# Altium integrated library Blues Wireless Library.IntLib: 99 symbols (part 1 of 2) (continued)
## EDGE-200-CM3_0 (continued)
text: TOP; BOTTOM

## EDGE-200-CM3_1
designator J?, comment TPS  (value not drawn)
Modello: EDGE-DDR2; Caratteristiche: 200P; Famiglia: CONNETTORE
footprint DDR2-EDGE-200
pins: 1 GND (power), 2 ~{EMMC_DISABLE}, 3 GPIO0 (io), 4 SDX_VDD (power), 5 GPIO1 (io), 6 SDX_VDD (power), 7 GND (power), 8 GND (power), 9 GPIO2 (io), 10 SDX_CLK (in), 11 GPIO3 (io), 12 SDX_CMD (io), 13 GND (power), 14 GND (power), 15 GPIO4 (io), 16 SDX_D0 (io), 17 GPIO5 (io), 18 SDX_D1 (io), 19 GND (power), 20 GND (power), 21 GPIO6 (io), 22 SDX_D2 (io), 23 GPIO7 (io), 24 SDX_D3 (io), 25 GND (power), 26 GND (power), 27 GPIO8 (io), 28 GPIO28 (io), 29 GPIO9 (io), 30 GPIO29 (io), 31 GND (power), 32 GND (power), 33 GPIO10 (io), 34 GPIO30 (io), 35 GPIO11 (io), 36 GPIO31 (io), 37 GND (power), 38 GND (power), 39 GPIO0-27_VDD (power), 40 GPIO0-27_VDD (power), 41 GPIO28-45_VDD (power), 42 GPIO28-45_VDD (power), 43 GND (power), 44 GND (power), 45 GPIO12 (io), 46 GPIO32 (io), 47 GPIO13 (io), 48 GPIO33 (io), 49 GND (power), 50 GND (power), 51 GPIO14 (io), 52 GPIO34 (io), 53 GPIO15 (io), 54 GPIO35 (io), 55 GND (power), 56 GND (power), 57 GPIO16 (io), 58 GPIO36 (io), 59 GPIO17 (io), 60 GPIO37 (io), 61 GND (power), 62 GND (power), 63 GPIO18 (io), 64 GPIO38 (io), 65 GPIO19 (io), 66 GPIO39 (io), 67 GND (power), 68 GND (power), 69 GPIO20 (io), 70 GPIO40 (io), 71 GPIO21 (io), 72 GPIO41 (io), 73 GND (power), 74 GND (power), 75 GPIO22 (io), 76 GPIO42 (io), 77 GPIO23 (io), 78 GPIO43 (io), 79 GND (power), 80 GND (power), 81 GPIO24 (io), 82 GPIO44 (io), 83 GPIO25 (io), 84 GPIO45 (io), 85 GND (power), 86 GND (power), 87 GPIO26 (io), 88 ~{HDMI_HPD_1V8} (out), 89 GPIO27 (io), 90 ~{EMMC_EN_1V8} (in), 91 GND (power), 92 GND (power), 93 DSI0_DN1 (in), 94 DSI1_DP0 (in), 95 DSI0_DP1 (in), 96 DSI1_DN0 (in), 97 GND (power), 98 GND (power), 99 DSI0_DN0 (in), 100 DSI1_CP (in), 101 DSI0_DP0 (in), 102 DSI1_CN (in), 103 GND (power), 104 GND (power), 105 DSI0_CN (in), 106 DSI1_DP3 (out), 107 DSI0_CP (in), 108 DSI1_DN3 (out), 109 GND (power), 110 GND (power), 111 HDMI_CLK_N (in), 112 DSI1_DP2 (in), 113 HDMI_CLK_P (in), 114 DSI1_DN2 (in), 115 GND (power), 116 GND (power), 117 HDMI_D0_N (in), 118 DSI1_DP1 (in), 119 HDMI_D0_P (in), 120 DSI1_DN1 (in), 121 GND (power), 122 GND (power), 123 HDMI_D1_N (in), 124 NC124, 125 HDMI_D1_P (in), 126 NC126, 127 GND (power), 128 NC128, 129 HDMI_D2_N (in), 130 NC130, 131 HDMI_D2_P (in), 132 NC132, 133 GND (power), 134 GND (power), 135 CAM1_DP3 (out), 136 CAM0_DP0 (out), 137 CAM1_DN3 (out), 138 CAM0_DN0 (out), 139 GND (power), 140 GND (power), 141 CAM1_DP2 (out), 142 CAM0_CP (out), 143 CAM1_DN2 (out), 144 CAM0_CN (out), 145 GND (power), 146 GND (power), 147 CAM1_CP (out), 148 CAM0_DP1 (out), 149 CAM1_CN (out), 150 CAM0_DN1 (out), 151 GND (power), 152 GND (power), 153 CAM1_DP1 (out), 154 NC154, 155 CAM1_DN1 (out), 156 NC156, 157 GND (power), 158 NC158, 159 CAM1_DP0 (out), 160 NC160, 161 CAM1_DN0 (out), 162 NC162, 163 GND (power), 164 GND (power), 165 USB_DP (io), 166 TVDAC (in), 167 USB_DM (io), 168 USB_OTGID (out), 169 GND (power), 170 GND (power), 171 HDMI_CEC (io), 172 ~{VC_TRST} (out), 173 HDMI_SDA (io), 174 VC_TDI (out), 175 HDMI_SCL (io), 176 VC_TMS (out), 177 RUN (out), 178 VC_TDO (in), 179 NC179, 180 VC_TCK (out), 181 GND (power), 182 GND (power), 183 NC183, 184 NC184, 185 NC185, 186 NC186, 187 GND (power), 188 GND (power), 189 NC189, 190 NC190, 191 NC191, 192 NC192, 193 NC193, 194 NC194, 195 GND (power), 196 GND (power), 197 VBAT (power), 198 VBAT (power), 199 VBAT (power), 200 VBAT (power)
text: TOP; BOTTOM

## FIDUCIAL
designator FID?, comment TPS  (value not drawn)
FIDUCIAL; Pkg Type: SMD; Distributor: FAE
footprint FIDUCIAL
pins: 1 TP

## GROVE - J-4-0200-MOS-GROVE
designator J?, comment GROVE
CONN. GROVE 4P M/90° P=2 1125R-SMT-4P SEEDSTUDIO SMT; Pkg Type: SMD; Famiglia: CONNETTORE; Database: 45891; Price Distributor Cad: 0,16; Modello: GROVE; Distributor: FAE; Caratteristiche: 4P
footprint J-4-0200-MOS-GROVE
pins: 1, 2, 3, 4

## KNOB - M2.5
designator ASS?, comment KNOB M2.5
VITE TCEI 2.5X5 ESAGONO INCASSATO A2 NERA; Database: 45057; Famiglia: MECCANICA; Pkg Type: THT; Caratteristiche: M2.5; Distributor: FAE; Modello: KNOB; Price Distributor Cad: 0,1467

## L - 0603CS-3N3XJLU-3.3n/0.7A
designator L?, comment 0603CS-3N3XJLU
INDUTTANZA 3.3nH 0.7A 5% 0603 0603CS-3N3XJLU COILCRAFT SMT; Caratteristiche: 700mA; Database: 43077; Famiglia: INDUTTORE; Modello: INDUTTANZA RF; Note: 5.9GHz; Pkg Type: SMD; Temp Range: -40°..+125°; Distributor: FAE; Price Distributor Cad: 0,59
footprint LS-0603CS
pins: 1 C, 2 A

## L - 0603CS-6N8XJLU-6.8n/0.7A
designator L?, comment 0603CS-6N8XJLU
INDUTTANZA 6.8nH 0.7A 5% 0603 0603CS-6N8XJLU COILCRAFT SMT; Caratteristiche: 700mA; Database: 43078; Famiglia: INDUTTORE; Modello: INDUTTANZA RF; Note: 5.9GHz; Pkg Type: SMD; Temp Range: -40°..+125°; Distributor: FAE; Price Distributor Cad: 0,59
footprint LS-0603CS
pins: 1 C, 2 A

## L - 1285AS-H-2R2M=P2-2.2u/1.5A
designator L?, comment 1285AS-H-2R2M=P2
INDUTTANZA 2.2uH 1.5A 20% 0806 1285AS-H-2R2M=P2 MURATA SMT; Database: 42807; Famiglia: INDUTTORE; Pkg Type: SMD; Temp Range: -40°..+85°; Caratteristiche: 1.5A; Distributor: FAE; Modello: INDUTTANZA; Price Distributor Cad: 0,329
footprint LS-0806
pins: 1 C, 2 A

## L - LQW15AN7N5H00D - 7.5n/0.57A
designator L?, comment LQW15AN7N5H00D
INDUTTANZA 7.5nH 0.57A 3% A FILO 0402 LQW15AN7N5H00D MURATA SMT; Caratteristiche: 570mA; Database: 43079; Famiglia: INDUTTORE; Note: Non Schermato - 6GHz; Pkg Type: SMD; Temp Range: -55°..+125°; Distributor: FAE; Modello: INDUTTANZA; Price Distributor Cad: 0,139
footprint LS-0402
pins: 1 C, 2 A

## LNA-RF - BGA725L6E6327FTSA1
designator U?, comment BGA725L6E6327FTSA1  Consumo: Consumo 3V3: 3.6mA
INTEGRATO BGA725L6E6327FTSA1 INFINEON TSLP-6 SMT; Caratteristiche: RF; Database: 43081; Modello: LNA; Note: VCC=1.5V - 3.6V; Pkg Type: SMD; Temp Range: -40°..+125°; Distributor: FAE; Famiglia: INTEGRATO; Price Distributor Cad: 0,2907
footprint XFDFN6
pins: 1 GND (power), 2 VCC (power), 3 AO (out), 4 GNDRF (power), 5 AI (in), 6 PON (in)

## MyFAETechnology
designator *  Project designer: G.Boschini  Project manager: Not approved  Customer name: Nome Cliente  DocumentoRev: See Revision Page  FAE RD mail: Mail: info@fae.technology  FAE RD ind: via C. Battisti 136, 24025, Gazzaniga (Bg), Italy  FAE RD tel: Tel: +39 035738130  FAE RD code: 2017-30xx  Revision: 1  (graphical)
Customer Code: -; Nome Progetto: Nome Progetto; Databse: -
text: Project; Page name; Board; Designer; Approved; Project Code; Customer; Internal Code; Code; Data; Rev.; Rev. changes; Sheet; /; Il presente progetto è tutelato dalla legge sul diritto d'autore, che vieta a terzi la riproduzione e l'utilizzo anche parziale senza il consenso di FAE Technology S.p.A.

## NANOSIM - J-NANOSIM-SF72S006VBA
designator J6, comment NanoSIM - SF72S006VBAR2500
CONN. NANOSIM 8P F/90° PUSH-PUSH SF72S006VBAR2500 JAE ELECTRONICS SMT; Famiglia: CONNETTORE; Database: 41049; Temp Range: -25°..+85°; Pkg Type: SMD; ROOM: NANO-SIM; Modello: NanoSIM; Price Distributor Cad: 0,7362; Distributor: FAE; Supplier 1: Digi-Key; Supplier Part Number 1: 670-2799-1-ND
footprint J-NANOSIM-SF72S006VBA
pins: 1 VCC (power), 2 RST (in), 3 CLK (in), 5 GND (power), 6 VPP, 7 IO (io), 8 GND (power), 9 GND (power), 10 CSW, 11 GND (power), 12 GND (power), 13 DSW, 14 GND (power), 15 GND (power), 16 GND (power), 17 GND (power), 18 GND (power), 19 GND (power)

## NMOS - AO3420 - 6A/20V
designator Q?, comment AO3420
TRANSISTOR MOSFET N AO3420 SOT-23 ALPHA-OMEGA SMT; Temp Range: -55°..+150°; Pkg Type: SMD; Database: 41965; Caratteristiche: 6A(Ta)/20V; Note: Vth=0.75V - Rdson=25mohm; Modello: NMOS; Price Distributor Cad: 0,0344; Distributor: FAE; Famiglia: TRANSISTOR
footprint SOT23
pins: 1 G, 2 S, 3 D
text: n

## PCB-CS
designator CS?, comment CS Vx xL xum
C.S. Nome Vx (XxY)mm xL/SO/SR sp=1.6mm Cu=35um; Famiglia: CIRCUITO STAMPATO; Caratteristiche: Nome Schematico; Note: Autore Schematico; Modello: Cliente; Price Distributor Cad: 0; Distributor: WE-ONLINE

## PORTA BATTERIA 3xAA - 2464
designator BAT?, comment 2464
PORTA BATTERIA 2464 KEYSTONE; Caratteristiche: 3xAA; Database: 45254; Pkg Type: THT; Distributor: FAE; Famiglia: BATTERIA; Modello: PORTA BATTERIA; Price Distributor Cad: 1,0965
footprint BATHLD-2464
pins: 1 +, 2 -

## PW-XFL4020-222ME - 2.2u/3.1A
designator L?, comment XFL4020-222MEC
INDUTTANZA 2.2 uH 3.1A 20% XFL4020-222MEC COILCRAFT SMT; Modello: FISSO; Famiglia: INDUTTORE; Temp Range: -40°..+125°; Pkg Type: SMD; Database: 42400; Caratteristiche: 3.1A; Price Distributor Cad: 1,61; Distributor: FAE
footprint LS-XFL4020
pins: 1, 2

## RAPIDO - 0603SFV350F- 3.5A/32V
designator F?, comment 3.5A/32V
FUSIBILE RAPIDO 3.5A 32V 0603 0603SFV350F/32-2 LITTELFUSE SMT; Pkg Type: SMD; Temp Range: -55°..+125°; Database: 40054; Modello: RAPIDO; Caratteristiche: 3.5A/32V; Famiglia: FUSIBILE; Distributor: FAE; Price Distributor Cad: 0,515
footprint FS-0603
pins: 1, 2

## RAPIDO - SF-0603F150-2-1.5A/32V
designator F?, comment SF-0603F150-2
FUSIBILE RAPIDO 1.5A 32V 0603 SF-0603F150-2 BOURNS SMT; Caratteristiche: 1.5A/32V; Database: 32505; Pkg Type: SMD; Temp Range: -40°..+105°; Distributor: FAE; Famiglia: FUSIBILE; Modello: RAPIDO; Price Distributor Cad: 0,185
footprint FS-0603
pins: 1, 2
text: F1.5A

## RR-8X-1506-100r/5%
designator RR?, comment 100R/5%
RETE RESISTIVA 8R sing. 100R 5% 1506 CAY16-101J8LF BOURNS SMT; Note: 200ppm; Caratteristiche: 8X; Famiglia: RESISTENZA; Pkg Type: SMD; Temp Range: -55°..+125°; Database: 40062; Modello: RETE; Distributor: FAE; Price Distributor Cad: 0,036
footprint RR-8X-1506
pins: 1, 2, 3, 4, 5, 6, 7, 8, 9, 10, 11, 12, 13, 14, 15, 16

## RS-0402
designator R?, comment NU
CHIP RES. 0402; Pkg Type: SMD; Famiglia: RESISTENZA; Modello: FISSO
footprint RS-0402
pins: 1, 2

## RS-0402-0r
designator R?, comment 0R
CHIP RES. 0R 0402 1/16W 1%; Modello: FISSO; Famiglia: RESISTENZA; Pkg Type: SMD; Database: 25681; Caratteristiche: 1%; Distributor: FAE; Price Distributor Cad: 0,0005
footprint RS-0402
pins: 1, 2

## RS-0402-10k
designator R?, comment 10k
CHIP RES. 10K 0402 1/16W 1%; Modello: FISSO; Famiglia: RESISTENZA; Database: 25129; Temp Range: -55°..+125°; Pkg Type: SMD; Caratteristiche: 1%; Price Distributor Cad: 0,0007; Distributor: FAE
footprint RS-0402
pins: 1, 2

## RS-0402-10M/5%
designator R?, comment 10M/5%
CHIP RES. 10M 0402 1/8W 5%; Modello: FISSO; Famiglia: RESISTENZA; Database: 37511; Temp Range: -55°..+125°; Pkg Type: SMD; Caratteristiche: 5%; Price Distributor Cad: 0,0004; Distributor: FAE
footprint RS-0402
pins: 1, 2

## RS-0402-82k
designator R?, comment 82k
CHIP RES. 82K 0402 1/16W 1%; Modello: FISSO; Famiglia: RESISTENZA; Pkg Type: SMD; Temp Range: -55°..+155°; Database: 40683; Caratteristiche: 1%; Distributor: FAE; Price Distributor Cad: 0,0016
footprint RS-0402
pins: 1, 2

## RS-0402-100k
designator R?, comment 100k
CHIP RES. 100K 0402 1/16W 1%; Modello: FISSO; Famiglia: RESISTENZA; Pkg Type: SMD; Database: 25127; Caratteristiche: 1%; Distributor: FAE; Price Distributor Cad: 0,0004
footprint RS-0402
pins: 1, 2

## RS-0603-22r
designator R55, comment 22R
CHIP RES. 22R 0603 1/16W 1%; Pkg Type: SMD; Database: 20385; Famiglia: RESISTENZA; Modello: FISSO; ROOM: NANO-SIM; Distributor: FAE; Price Distributor Cad: 0,0005; Caratteristiche: 1%
footprint RESC0603(1608)_L (Chip Resistor, Body 1.6x0.8mm, IPC High Density)
pins: 1, 2

## RS-1206-1M
designator R?, comment 1M
CHIP RES. 1M 1206 1/4W 1%; Database: 28883; Pkg Type: SMD; Modello: FISSO; Famiglia: RESISTENZA; Price Distributor Cad: 0,0011; Distributor: FAE; Caratteristiche: 1%
footprint RS-1206
pins: 1, 2

## SCHOTTKY - FSV1045V - 10A/45V
designator DS?, comment FSV1045V
DIODO SCHOTTKY 10A 45V FSV1045V TO277-3 SMT; Caratteristiche: 10A/45V; Database: 42269; Temp Range: -55°..+150°; Pkg Type: SMD; Famiglia: DIODO; Modello: SCHOTTKY; Price Distributor Cad: 0,4703; Distributor: FAE
footprint TO277-3
pins: 1 A1, 2 A2, 3 C

## SCHOTTKY-STPS3H100U - 3A/100V
designator DS?, comment STPS3H100U
DIODO SCHOTTKY 3A 100V STPS3H100U SMB SMT; Caratteristiche: 3A/100V; Database: 40665; Pkg Type: SMD; Distributor: FAE; Famiglia: DIODO; Modello: SCHOTTKY; Price Distributor Cad: 0,191
footprint SMB
pins: 1 C, 2 A

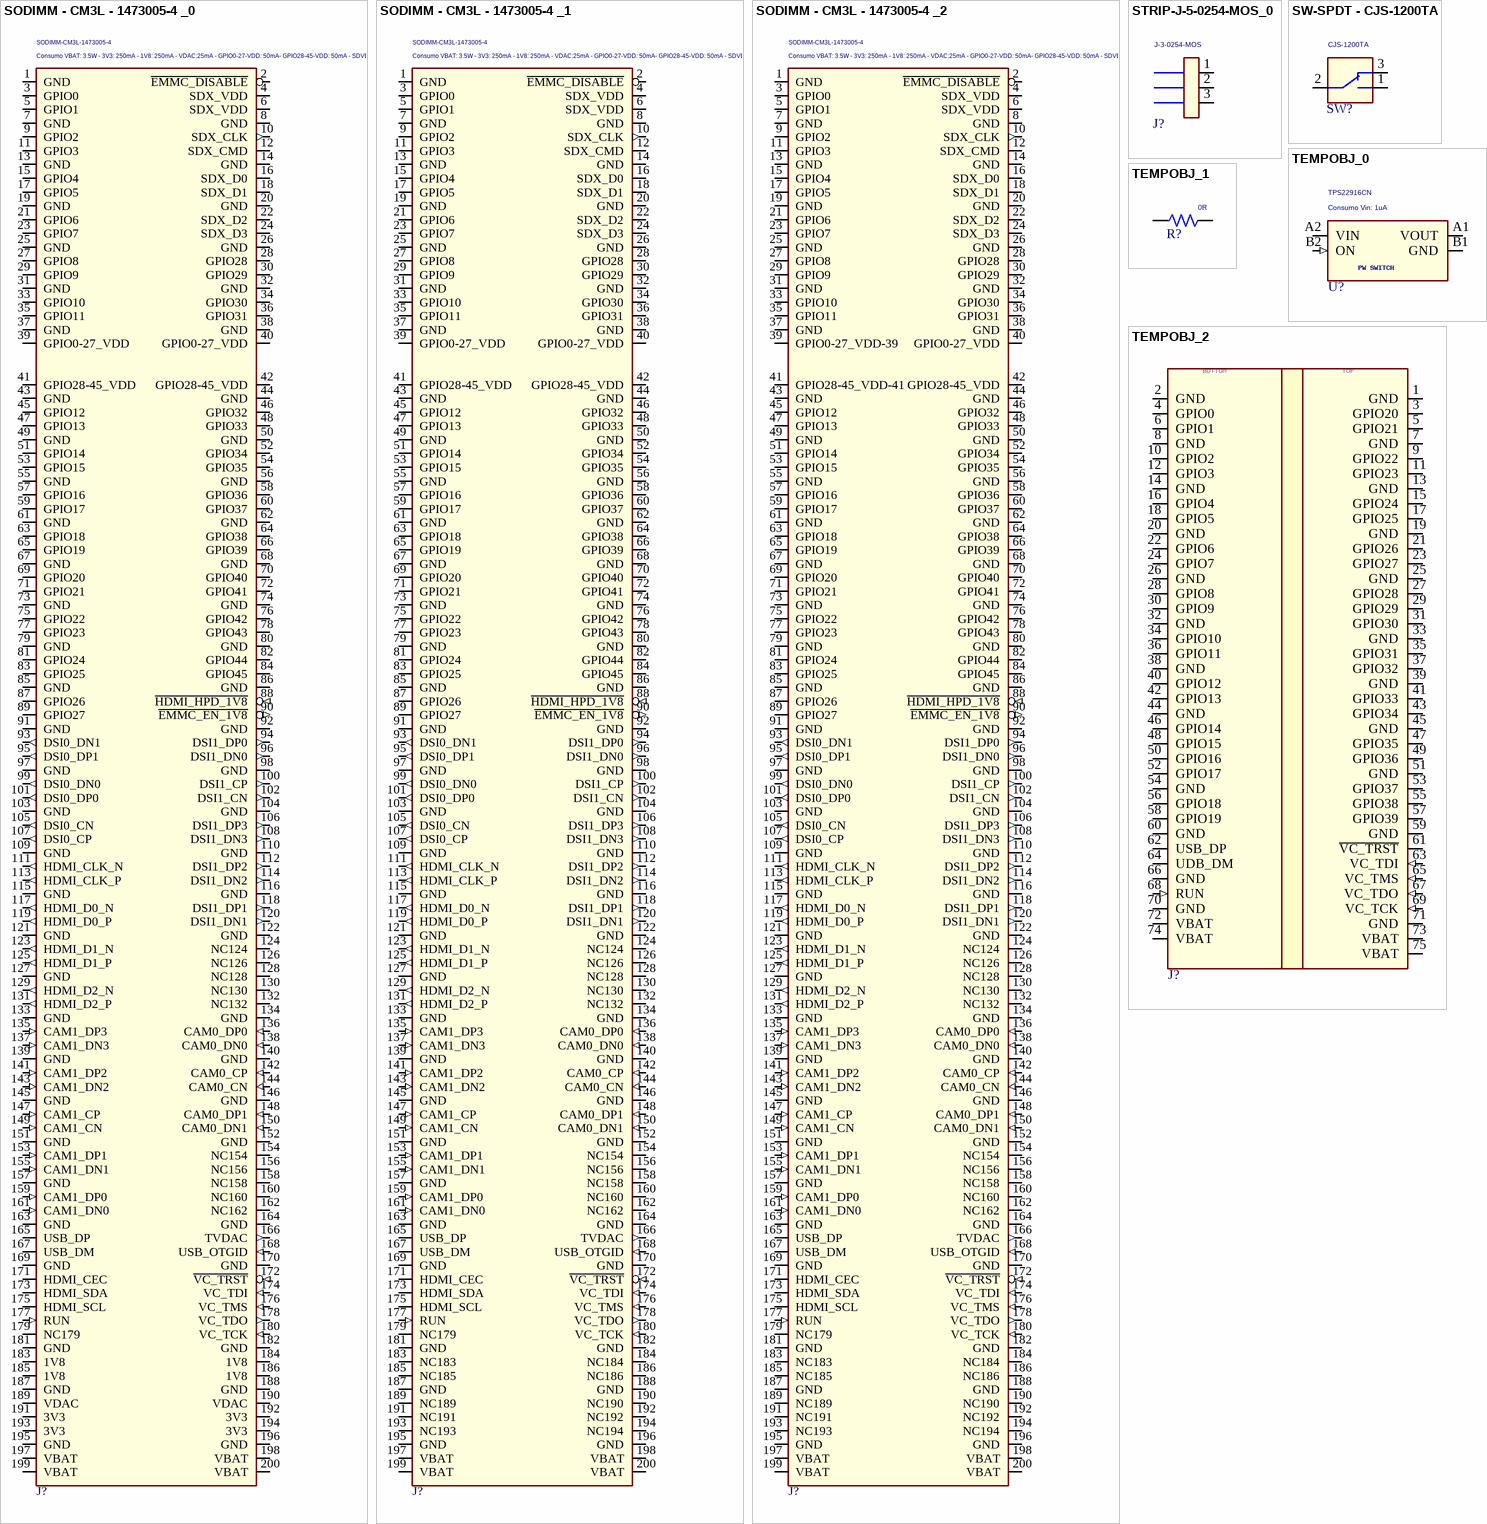
[diagram p4: symbols SODIMM - CM3L - 1473005-4 _0 to TEMPOBJ_2]

## SODIMM - CM3L - 1473005-4 _0
designator J?, comment SODIMM-CM3L-1473005-4  Consumo: Consumo VBAT: 3.5W - 3V3: 250mA - 1V8: 250mA - VDAC:25mA - GPIO0-27-VDD: 50mA- GPIO28-45-VDD: 50mA - SDVDD:50mA
CONN. DDR2 200P M/D DOPPIA FILA DIMM 1473005-4 TYCO SMT; Famiglia: CONNETTORE; Database: 27986; Temp Range: -55°..+85°; Pkg Type: SMD; Modello: SODIMM-CM3L; Caratteristiche: 200P; Price Distributor Cad: 1,73; Distributor: FAE
footprint J-200-0060-MOS-1473005-4
pins: 1 GND (power), 2 ~{EMMC_DISABLE}, 3 GPIO0 (io), 4 SDX_VDD (power), 5 GPIO1 (io), 6 SDX_VDD (power), 7 GND (power), 8 GND (power), 9 GPIO2 (io), 10 SDX_CLK (out), 11 GPIO3 (io), 12 SDX_CMD (io), 13 GND (power), 14 GND (power), 15 GPIO4 (io), 16 SDX_D0 (io), 17 GPIO5 (io), 18 SDX_D1 (io), 19 GND (power), 20 GND (power), 21 GPIO6 (io), 22 SDX_D2 (io), 23 GPIO7 (io), 24 SDX_D3 (io), 25 GND (power), 26 GND (power), 27 GPIO8 (io), 28 GPIO28 (io), 29 GPIO9 (io), 30 GPIO29 (io), 31 GND (power), 32 GND (power), 33 GPIO10 (io), 34 GPIO30 (io), 35 GPIO11 (io), 36 GPIO31 (io), 37 GND (power), 38 GND (power), 39 GPIO0-27_VDD (power), 40 GPIO0-27_VDD (power), 41 GPIO28-45_VDD (power), 42 GPIO28-45_VDD (power), 43 GND (power), 44 GND (power), 45 GPIO12 (io), 46 GPIO32 (io), 47 GPIO13 (io), 48 GPIO33 (io), 49 GND (power), 50 GND (power), 51 GPIO14 (io), 52 GPIO34 (io), 53 GPIO15 (io), 54 GPIO35 (io), 55 GND (power), 56 GND (power), 57 GPIO16 (io), 58 GPIO36 (io), 59 GPIO17 (io), 60 GPIO37 (io), 61 GND (power), 62 GND (power), 63 GPIO18 (io), 64 GPIO38 (io), 65 GPIO19 (io), 66 GPIO39 (io), 67 GND (power), 68 GND (power), 69 GPIO20 (io), 70 GPIO40 (io), 71 GPIO21 (io), 72 GPIO41 (io), 73 GND (power), 74 GND (power), 75 GPIO22 (io), 76 GPIO42 (io), 77 GPIO23 (io), 78 GPIO43 (io), 79 GND (power), 80 GND (power), 81 GPIO24 (io), 82 GPIO44 (io), 83 GPIO25 (io), 84 GPIO45 (io), 85 GND (power), 86 GND (power), 87 GPIO26 (io), 88 ~{HDMI_HPD_1V8} (in), 89 GPIO27 (io), 90 ~{EMMC_EN_1V8} (out), 91 GND (power), 92 GND (power), 93 DSI0_DN1 (out), 94 DSI1_DP0 (out), 95 DSI0_DP1 (out), 96 DSI1_DN0 (out), 97 GND (power), 98 GND (power), 99 DSI0_DN0 (out), 100 DSI1_CP (out), 101 DSI0_DP0 (out), 102 DSI1_CN (out), 103 GND (power), 104 GND (power), 105 DSI0_CN (out), 106 DSI1_DP3 (out), 107 DSI0_CP (out), 108 DSI1_DN3 (out), 109 GND (power), 110 GND (power), 111 HDMI_CLK_N (out), 112 DSI1_DP2 (out), 113 HDMI_CLK_P (out), 114 DSI1_DN2 (out), 115 GND (power), 116 GND (power), 117 HDMI_D0_N (out), 118 DSI1_DP1 (out), 119 HDMI_D0_P (out), 120 DSI1_DN1 (out), 121 GND (power), 122 GND (power), 123 HDMI_D1_N (out), 124 NC124, 125 HDMI_D1_P (out), 126 NC126, 127 GND (power), 128 NC128, 129 HDMI_D2_N (out), 130 NC130, 131 HDMI_D2_P (out), 132 NC132, 133 GND (power), 134 GND (power), 135 CAM1_DP3 (in), 136 CAM0_DP0 (in), 137 CAM1_DN3 (in), 138 CAM0_DN0 (in), 139 GND (power), 140 GND (power), 141 CAM1_DP2 (in), 142 CAM0_CP (in), 143 CAM1_DN2 (in), 144 CAM0_CN (in), 145 GND (power), 146 GND (power), 147 CAM1_CP (in), 148 CAM0_DP1 (in), 149 CAM1_CN (in), 150 CAM0_DN1 (in), 151 GND (power), 152 GND (power), 153 CAM1_DP1 (in), 154 NC154, 155 CAM1_DN1 (in), 156 NC156, 157 GND (power), 158 NC158, 159 CAM1_DP0 (in), 160 NC160, 161 CAM1_DN0 (in), 162 NC162, 163 GND (power), 164 GND (power), 165 USB_DP (io), 166 TVDAC (out), 167 USB_DM (io), 168 USB_OTGID (in), 169 GND (power), 170 GND (power), 171 HDMI_CEC (io), 172 ~{VC_TRST} (in), 173 HDMI_SDA (io), 174 VC_TDI (in), 175 HDMI_SCL (io), 176 VC_TMS (in), 177 RUN (in), 178 VC_TDO (out), 179 NC179, 180 VC_TCK (in), 181 GND (power), 182 GND (power), 183 1V8, 184 1V8, 185 1V8, 186 1V8, 187 GND (power), 188 GND (power), 189 VDAC, 190 VDAC, 191 3V3, 192 3V3, 193 3V3, 194 3V3, 195 GND (power), 196 GND (power), 197 VBAT (power), 198 VBAT (power), 199 VBAT (power), 200 VBAT (power)

## SODIMM - CM3L - 1473005-4 _1
designator J?, comment SODIMM-CM3L-1473005-4  Consumo: Consumo VBAT: 3.5W - 3V3: 250mA - 1V8: 250mA - VDAC:25mA - GPIO0-27-VDD: 50mA- GPIO28-45-VDD: 50mA - SDVDD:50mA
CONN. DDR2 200P M/D DOPPIA FILA DIMM 1473005-4 TYCO SMT; Famiglia: CONNETTORE; Database: 27986; Temp Range: -55°..+85°; Pkg Type: SMD; Modello: SODIMM-CM3L; Caratteristiche: 200P; Price Distributor Cad: 1,73; Distributor: FAE
footprint J-200-0060-MOS-1473005-4
pins: 1 GND (power), 2 ~{EMMC_DISABLE}, 3 GPIO0 (io), 4 SDX_VDD (power), 5 GPIO1 (io), 6 SDX_VDD (power), 7 GND (power), 8 GND (power), 9 GPIO2 (io), 10 SDX_CLK (out), 11 GPIO3 (io), 12 SDX_CMD (io), 13 GND (power), 14 GND (power), 15 GPIO4 (io), 16 SDX_D0 (io), 17 GPIO5 (io), 18 SDX_D1 (io), 19 GND (power), 20 GND (power), 21 GPIO6 (io), 22 SDX_D2 (io), 23 GPIO7 (io), 24 SDX_D3 (io), 25 GND (power), 26 GND (power), 27 GPIO8 (io), 28 GPIO28 (io), 29 GPIO9 (io), 30 GPIO29 (io), 31 GND (power), 32 GND (power), 33 GPIO10 (io), 34 GPIO30 (io), 35 GPIO11 (io), 36 GPIO31 (io), 37 GND (power), 38 GND (power), 39 GPIO0-27_VDD (power), 40 GPIO0-27_VDD (power), 41 GPIO28-45_VDD (power), 42 GPIO28-45_VDD (power), 43 GND (power), 44 GND (power), 45 GPIO12 (io), 46 GPIO32 (io), 47 GPIO13 (io), 48 GPIO33 (io), 49 GND (power), 50 GND (power), 51 GPIO14 (io), 52 GPIO34 (io), 53 GPIO15 (io), 54 GPIO35 (io), 55 GND (power), 56 GND (power), 57 GPIO16 (io), 58 GPIO36 (io), 59 GPIO17 (io), 60 GPIO37 (io), 61 GND (power), 62 GND (power), 63 GPIO18 (io), 64 GPIO38 (io), 65 GPIO19 (io), 66 GPIO39 (io), 67 GND (power), 68 GND (power), 69 GPIO20 (io), 70 GPIO40 (io), 71 GPIO21 (io), 72 GPIO41 (io), 73 GND (power), 74 GND (power), 75 GPIO22 (io), 76 GPIO42 (io), 77 GPIO23 (io), 78 GPIO43 (io), 79 GND (power), 80 GND (power), 81 GPIO24 (io), 82 GPIO44 (io), 83 GPIO25 (io), 84 GPIO45 (io), 85 GND (power), 86 GND (power), 87 GPIO26 (io), 88 ~{HDMI_HPD_1V8} (in), 89 GPIO27 (io), 90 ~{EMMC_EN_1V8} (out), 91 GND (power), 92 GND (power), 93 DSI0_DN1 (out), 94 DSI1_DP0 (out), 95 DSI0_DP1 (out), 96 DSI1_DN0 (out), 97 GND (power), 98 GND (power), 99 DSI0_DN0 (out), 100 DSI1_CP (out), 101 DSI0_DP0 (out), 102 DSI1_CN (out), 103 GND (power), 104 GND (power), 105 DSI0_CN (out), 106 DSI1_DP3 (out), 107 DSI0_CP (out), 108 DSI1_DN3 (out), 109 GND (power), 110 GND (power), 111 HDMI_CLK_N (out), 112 DSI1_DP2 (out), 113 HDMI_CLK_P (out), 114 DSI1_DN2 (out), 115 GND (power), 116 GND (power), 117 HDMI_D0_N (out), 118 DSI1_DP1 (out), 119 HDMI_D0_P (out), 120 DSI1_DN1 (out), 121 GND (power), 122 GND (power), 123 HDMI_D1_N (out), 124 NC124, 125 HDMI_D1_P (out), 126 NC126, 127 GND (power), 128 NC128, 129 HDMI_D2_N (out), 130 NC130, 131 HDMI_D2_P (out), 132 NC132, 133 GND (power), 134 GND (power), 135 CAM1_DP3 (in), 136 CAM0_DP0 (in), 137 CAM1_DN3 (in), 138 CAM0_DN0 (in), 139 GND (power), 140 GND (power), 141 CAM1_DP2 (in), 142 CAM0_CP (in), 143 CAM1_DN2 (in), 144 CAM0_CN (in), 145 GND (power), 146 GND (power), 147 CAM1_CP (in), 148 CAM0_DP1 (in), 149 CAM1_CN (in), 150 CAM0_DN1 (in), 151 GND (power), 152 GND (power), 153 CAM1_DP1 (in), 154 NC154, 155 CAM1_DN1 (in), 156 NC156, 157 GND (power), 158 NC158, 159 CAM1_DP0 (in), 160 NC160, 161 CAM1_DN0 (in), 162 NC162, 163 GND (power), 164 GND (power), 165 USB_DP (io), 166 TVDAC (out), 167 USB_DM (io), 168 USB_OTGID (in), 169 GND (power), 170 GND (power), 171 HDMI_CEC (io), 172 ~{VC_TRST} (in), 173 HDMI_SDA (io), 174 VC_TDI (in), 175 HDMI_SCL (io), 176 VC_TMS (in), 177 RUN (in), 178 VC_TDO (out), 179 NC179, 180 VC_TCK (in), 181 GND (power), 182 GND (power), 183 NC183, 184 NC184, 185 NC185, 186 NC186, 187 GND (power), 188 GND (power), 189 NC189, 190 NC190, 191 NC191, 192 NC192, 193 NC193, 194 NC194, 195 GND (power), 196 GND (power), 197 VBAT (power), 198 VBAT (power), 199 VBAT (power), 200 VBAT (power)

## SODIMM - CM3L - 1473005-4 _2
designator J?, comment SODIMM-CM3L-1473005-4  Consumo: Consumo VBAT: 3.5W - 3V3: 250mA - 1V8: 250mA - VDAC:25mA - GPIO0-27-VDD: 50mA- GPIO28-45-VDD: 50mA - SDVDD:50mA
CONN. DDR2 200P M/D DOPPIA FILA DIMM 1473005-4 TYCO SMT; Pkg Type: SMD; Temp Range: -55°..+85°; Database: 27986; Famiglia: CONNETTORE; Distributor: FAE; Price Distributor Cad: 1,73; Caratteristiche: 200P; Modello: SODIMM-CM3L
footprint J-200-0060-MOS-1473005-4
pins: 1 GND (power), 2 ~{EMMC_DISABLE}, 3 GPIO0 (io), 4 SDX_VDD (power), 5 GPIO1 (io), 6 SDX_VDD (power), 7 GND (power), 8 GND (power), 9 GPIO2 (io), 10 SDX_CLK (out), 11 GPIO3 (io), 12 SDX_CMD (io), 13 GND (power), 14 GND (power), 15 GPIO4 (io), 16 SDX_D0 (io), 17 GPIO5 (io), 18 SDX_D1 (io), 19 GND (power), 20 GND (power), 21 GPIO6 (io), 22 SDX_D2 (io), 23 GPIO7 (io), 24 SDX_D3 (io), 25 GND (power), 26 GND (power), 27 GPIO8 (io), 28 GPIO28 (io), 29 GPIO9 (io), 30 GPIO29 (io), 31 GND (power), 32 GND (power), 33 GPIO10 (io), 34 GPIO30 (io), 35 GPIO11 (io), 36 GPIO31 (io), 37 GND (power), 38 GND (power), 39 GPIO0-27_VDD-39, 40 GPIO0-27_VDD, 41 GPIO28-45_VDD-41, 42 GPIO28-45_VDD, 43 GND (power), 44 GND (power), 45 GPIO12 (io), 46 GPIO32 (io), 47 GPIO13 (io), 48 GPIO33 (io), 49 GND (power), 50 GND (power), 51 GPIO14 (io), 52 GPIO34 (io), 53 GPIO15 (io), 54 GPIO35 (io), 55 GND (power), 56 GND (power), 57 GPIO16 (io), 58 GPIO36 (io), 59 GPIO17 (io), 60 GPIO37 (io), 61 GND (power), 62 GND (power), 63 GPIO18 (io), 64 GPIO38 (io), 65 GPIO19 (io), 66 GPIO39 (io), 67 GND (power), 68 GND (power), 69 GPIO20 (io), 70 GPIO40 (io), 71 GPIO21 (io), 72 GPIO41 (io), 73 GND (power), 74 GND (power), 75 GPIO22 (io), 76 GPIO42 (io), 77 GPIO23 (io), 78 GPIO43 (io), 79 GND (power), 80 GND (power), 81 GPIO24 (io), 82 GPIO44 (io), 83 GPIO25 (io), 84 GPIO45 (io), 85 GND (power), 86 GND (power), 87 GPIO26 (io), 88 ~{HDMI_HPD_1V8} (in), 89 GPIO27 (io), 90 ~{EMMC_EN_1V8} (out), 91 GND (power), 92 GND (power), 93 DSI0_DN1 (out), 94 DSI1_DP0 (out), 95 DSI0_DP1 (out), 96 DSI1_DN0 (out), 97 GND (power), 98 GND (power), 99 DSI0_DN0 (out), 100 DSI1_CP (out), 101 DSI0_DP0 (out), 102 DSI1_CN (out), 103 GND (power), 104 GND (power), 105 DSI0_CN (out), 106 DSI1_DP3 (out), 107 DSI0_CP (out), 108 DSI1_DN3 (out), 109 GND (power), 110 GND (power), 111 HDMI_CLK_N (out), 112 DSI1_DP2 (out), 113 HDMI_CLK_P (out), 114 DSI1_DN2 (out), 115 GND (power), 116 GND (power), 117 HDMI_D0_N (out), 118 DSI1_DP1 (out), 119 HDMI_D0_P (out), 120 DSI1_DN1 (out), 121 GND (power), 122 GND (power), 123 HDMI_D1_N (out), 124 NC124, 125 HDMI_D1_P (out), 126 NC126, 127 GND (power), 128 NC128, 129 HDMI_D2_N (out), 130 NC130, 131 HDMI_D2_P (out), 132 NC132, 133 GND (power), 134 GND (power), 135 CAM1_DP3 (in), 136 CAM0_DP0 (in), 137 CAM1_DN3 (in), 138 CAM0_DN0 (in), 139 GND (power), 140 GND (power), 141 CAM1_DP2 (in), 142 CAM0_CP (in), 143 CAM1_DN2 (in), 144 CAM0_CN (in), 145 GND (power), 146 GND (power), 147 CAM1_CP (in), 148 CAM0_DP1 (in), 149 CAM1_CN (in), 150 CAM0_DN1 (in), 151 GND (power), 152 GND (power), 153 CAM1_DP1 (in), 154 NC154, 155 CAM1_DN1 (in), 156 NC156, 157 GND (power), 158 NC158, 159 CAM1_DP0 (in), 160 NC160, 161 CAM1_DN0 (in), 162 NC162, 163 GND (power), 164 GND (power), 165 USB_DP (io), 166 TVDAC (out), 167 USB_DM (io), 168 USB_OTGID (in), 169 GND (power), 170 GND (power), 171 HDMI_CEC (io), 172 ~{VC_TRST} (in), 173 HDMI_SDA (io), 174 VC_TDI (in), 175 HDMI_SCL (io), 176 VC_TMS (in), 177 RUN (in), 178 VC_TDO (out), 179 NC179, 180 VC_TCK (in), 181 GND (power), 182 GND (power), 183 NC183, 184 NC184, 185 NC185, 186 NC186, 187 GND (power), 188 GND (power), 189 NC189, 190 NC190, 191 NC191, 192 NC192, 193 NC193, 194 NC194, 195 GND (power), 196 GND (power), 197 VBAT (power), 198 VBAT (power), 199 VBAT (power), 200 VBAT (power)

## STRIP-J-5-0254-MOS_0
designator J?, comment J-3-0254-MOS
STRIP 3P M/90° P=2.54 M20-8900505 HARWIN SMT; Database: 41113; Temp Range: -40°..+105°; Pkg Type: SMD; Caratteristiche: 3P/90°; Famiglia: CONNETTORE; Price Distributor Cad: 0,497; Distributor: FAE; Modello: STRIP
footprint J-3-0254-MOS
pins: 1, 2, 3

## SW-SPDT - CJS-1200TA
designator SW?, comment CJS-1200TA
INTERR. SLITTA ON-ON DA C.S. CJS-1200TA NIDEC COPAL ELECTRONICS SMT; Temp Range: -40°..+85°; Pkg Type: SMD; Note: SPDT - 100mA/6V; Modello: MECCANICO; Famiglia: SWITCH; Database: 43927; Caratteristiche: SPDT; Price Distributor Cad: 0,678; Distributor: FAE
footprint SW-CJS1200TA
pins: 1, 2, 3

## TEMPOBJ_0
designator U?, comment TPS22916CN  Consumo: Consumo Vin: 1uA
INTEGRATO TPS22916CN DSBGA4 TI SMT; Temp Range: -40°..+85°; Pkg Type: SMD; Caratteristiche: 2A; Note: 1 -5.5V - 100mOHM - ISD=100nA - VIH=1V - VIL=0.35V; Modello: HS POWER SWITCH; Price Distributor Cad: 0,59; Distributor: D-296-47463-1-ND; Famiglia: INTEGRATO
footprint DSBGA4
pins: A1 VOUT (power), A2 VIN (power), B1 GND (power), B2 ON (in)
text: PW SWITCH

## TEMPOBJ_1
designator R?, comment 0R
CHIP RES. 0R 0402 1/16W 1%; Modello: FISSO; Famiglia: RESISTENZA; Pkg Type: SMD; Database: 25681; Caratteristiche: 1%; Distributor: FAE; Price Distributor Cad: 0,0005
footprint RS-0402
pins: 1, 2

## TEMPOBJ_2
designator J?, comment MDT420E01001  (value not drawn)
CONN. 75P P=0.5 MDT420E01001 AMPHENOL SMT; Famiglia: CONNETTORE; Pkg Type: SMD; Temp Range: -40°..+80°; Caratteristiche: 75P; Distributor: D-MDT420E01001CT-ND; Price Distributor Cad: 1,21
footprint M2-E-AMPHENOL-75
pins: 1 GND (power), 2 GND (power), 3 GPIO20, 4 GPIO0, 5 GPIO21, 6 GPIO1, 7 GND (power), 8 GND (power), 9 GPIO22, 10 GPIO2, 11 GPIO23, 12 GPIO3, 13 GND (power), 14 GND (power), 15 GPIO24, 16 GPIO4, 17 GPIO25, 18 GPIO5, 19 GND (power), 20 GND (power), 21 GPIO26, 22 GPIO6, 23 GPIO27, 24 GPIO7, 25 GND (power), 26 GND (power), 27 GPIO28, 28 GPIO8, 29 GPIO29, 30 GPIO9, 31 GPIO30, 32 GND (power), 33 GND (power), 34 GPIO10, 35 GPIO31, 36 GPIO11, 37 GPIO32, 38 GND (power), 39 GND (power), 40 GPIO12, 41 GPIO33, 42 GPIO13, 43 GPIO34, 44 GND (power), 45 GND (power), 46 GPIO14, 47 GPIO35, 48 GPIO15, 49 GPIO36, 50 GPIO16, 51 GND (power), 52 GPIO17, 53 GPIO37, 54 GND (power), 55 GPIO38, 56 GPIO18, 57 GPIO39, 58 GPIO19, 59 GND (power), 60 GND (power), 61 ~{VC_TRST} (power), 62 USB_DP, 63 VC_TDI (in), 64 UDB_DM, 65 VC_TMS (in), 66 GND (power), 67 VC_TDO (in), 68 RUN (in), 69 VC_TCK (in), 70 GND (power), 71 GND (power), 72 VBAT (power), 73 VBAT (power), 74 VBAT (power), 75 VBAT (power)
text: BOTTOM; TOP

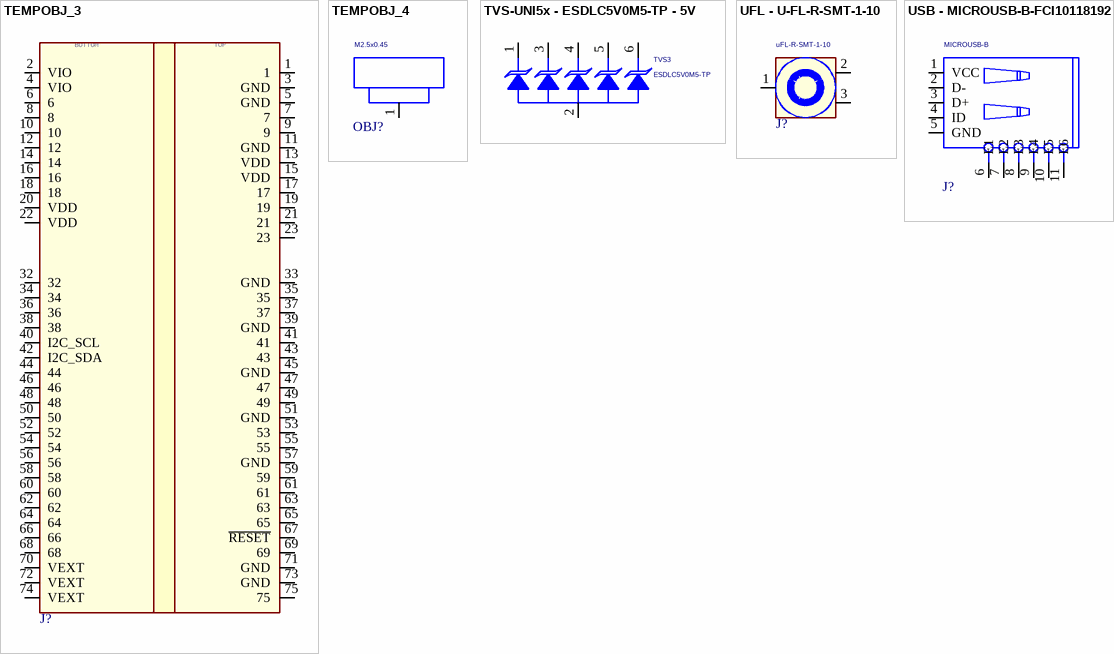
[diagram p5: symbols TEMPOBJ_3 to USB - MICROUSB-B-FCI10118192]

## TEMPOBJ_3
designator J?, comment MDT420E01001  (value not drawn)
CONN. 75P P=0.5 MDT420E01001 AMPHENOL SMT; Famiglia: CONNETTORE; Pkg Type: SMD; Temp Range: -40°..+80°; Caratteristiche: 75P; Distributor: D-MDT420E01001CT-ND; Price Distributor Cad: 1,21
footprint M2-E-AMPHENOL-75
pins: 1, 2 VIO (power), 3 GND (power), 4 VIO (power), 5 GND (power), 6, 7, 8, 9, 10, 11 GND (power), 12, 13 VDD (power), 14, 15 VDD (power), 16, 17, 18, 19, 20 VDD (power), 21, 22 VDD (power), 23, 32, 33 GND (power), 34, 35, 36, 37, 38, 39 GND (power), 40 I2C_SCL, 41, 42 I2C_SDA, 43, 44, 45 GND (power), 46, 47, 48, 49, 50, 51 GND (power), 52, 53, 54, 55, 56, 57 GND (power), 58, 59, 60, 61, 62, 63, 64, 65, 66, 67 ~{RESET}, 68, 69, 70 VEXT (power), 71 GND (power), 72 VEXT (power), 73 GND (power), 74 VEXT (power), 75
text: BOTTOM; TOP

## TEMPOBJ_4
designator OBJ?, comment M2.5x0.45
DISTANZ. ROTONDO 2.5MA 0.45 MM; Pkg Type: THT; Note: M2.5 x 0.45mm; Modello: DISTANZIALE; Famiglia: MECCANICA; Caratteristiche: M2.5; Price Distributor Cad: 1,10; Distributor: D-732-7078-1-ND
footprint DIST-WASMSIM0250
pins: 1 (power)

## TVS-UNI5x - ESDLC5V0M5-TP - 5V
designator TVS3, comment ESDLC5V0M5-TP
DIODO TVS TRANSIL UNIDIR. 20W 5V ESDLC5V0M5-TP SOT563 SMT; Temp Range: -65°..+150°; Pkg Type: SMD; Note: Cmax=10pF - SIM; Famiglia: PROTEZIONE; Database: 44643; Caratteristiche: 1.6A/5V/20W; Price Distributor Cad: 0,317; Modello: TVS; Distributor: FAE
footprint SOT666
pins: 1 C1, 2 A2, 3 C3, 4 C4, 5 A5, 6 C6

## UFL - U-FL-R-SMT-1-10
designator J?, comment uFL-R-SMT-1-10
CONN. RF M U.FL-R-SMT-1(10) HIROSE SMT; Pkg Type: SMD; Temp Range: -40°..+90°; Database: 28096; Famiglia: CONNETTORE; Note: 50ohm; Modello: UFL; Distributor: FAE; Price Distributor Cad: 0,11; Caratteristiche: RF
footprint J-3-MDS-UFL
pins: 1, 2, 3

## USB - MICROUSB-B-FCI10118192
designator J?, comment MICROUSB-B
CONN. USB F/90° TIPO MICRO-B C.S. 10118192-0001LF FCI SMT; Note: Full SMD; Famiglia: CONNETTORE; Pkg Type: SMD; Temp Range: -30°..+85°; Database: 40056; Modello: MICROUSB; Distributor: FAE; Price Distributor Cad: 0,097
footprint J-5-0065-FOS-MICROUSB10118192
pins: 1 VCC (power), 2 D- (io), 3 D+ (io), 4 ID, 5 GND (power), 6 E1, 7 E2, 8 E3, 9 E4, 10 E5, 11 E6


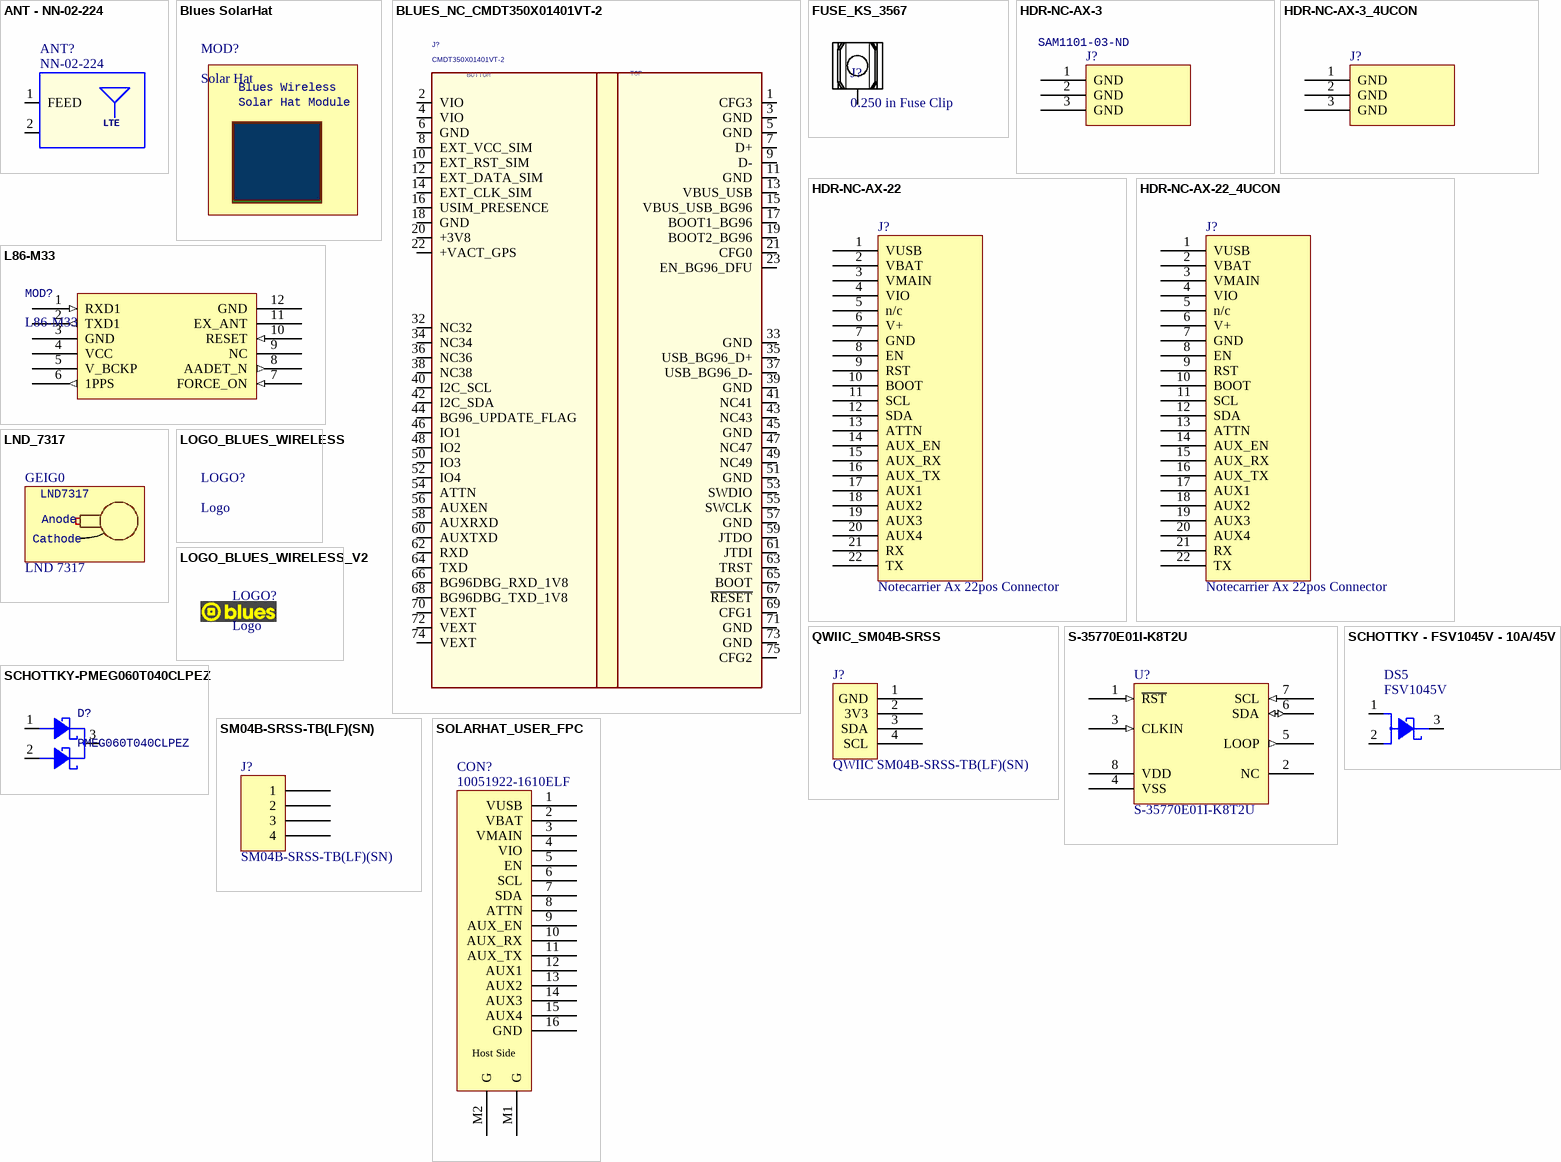
[diagram p6: symbols ANT - NN-02-224 to SOLARHAT_USER_FPC]

## ANT - NN-02-224
designator ANT?, comment NN-02-224
ANTENNA SMD IGNION NN-02-224 LTE-Cat M (12x3x2.4) SMT; Note: 700MHz, 800MHz, 850MHz, 900MHz, 1.7GHz, 1.8GHz, 1.9GHz, 2GHz, 2.1GHz, 2.3GHz, 2.5GHz, 2.6GHz, 3.5GHz, 3.7GHz BT, DCS, GNSS, GSM, LTE, PCS, UMTS, WiFi DB Chip RF Antenna 824MHz ~ 5.875GHz 1.9dBi Solder Surface Mount
footprint IGNION_NN02-224 (Antenna, SMT, 3x12x2.4mm)
pins: 1 FEED, 2 (power)
text: LTE

## Blues SolarHat
designator MOD?, comment Solar Hat  (mechanical)
Blues Solar Hat Module
footprint Blues_solarhat (Solarhat)
text: Blues Wireless; Solar Hat Module